# Altium footprint library Package_DFN_QFN.PcbLib: 557 footprints (part 26 of 35)
Each footprint in its own frame and in the unit in brackets; x right, y up, seen from the top. Pads: shape width x height; smd on the part's side, far side on the other; paste and mask are expansions set on the pad; w line width, h text height; cw(c..) or ccw(c..) is an arc to the next point about the centre after c.
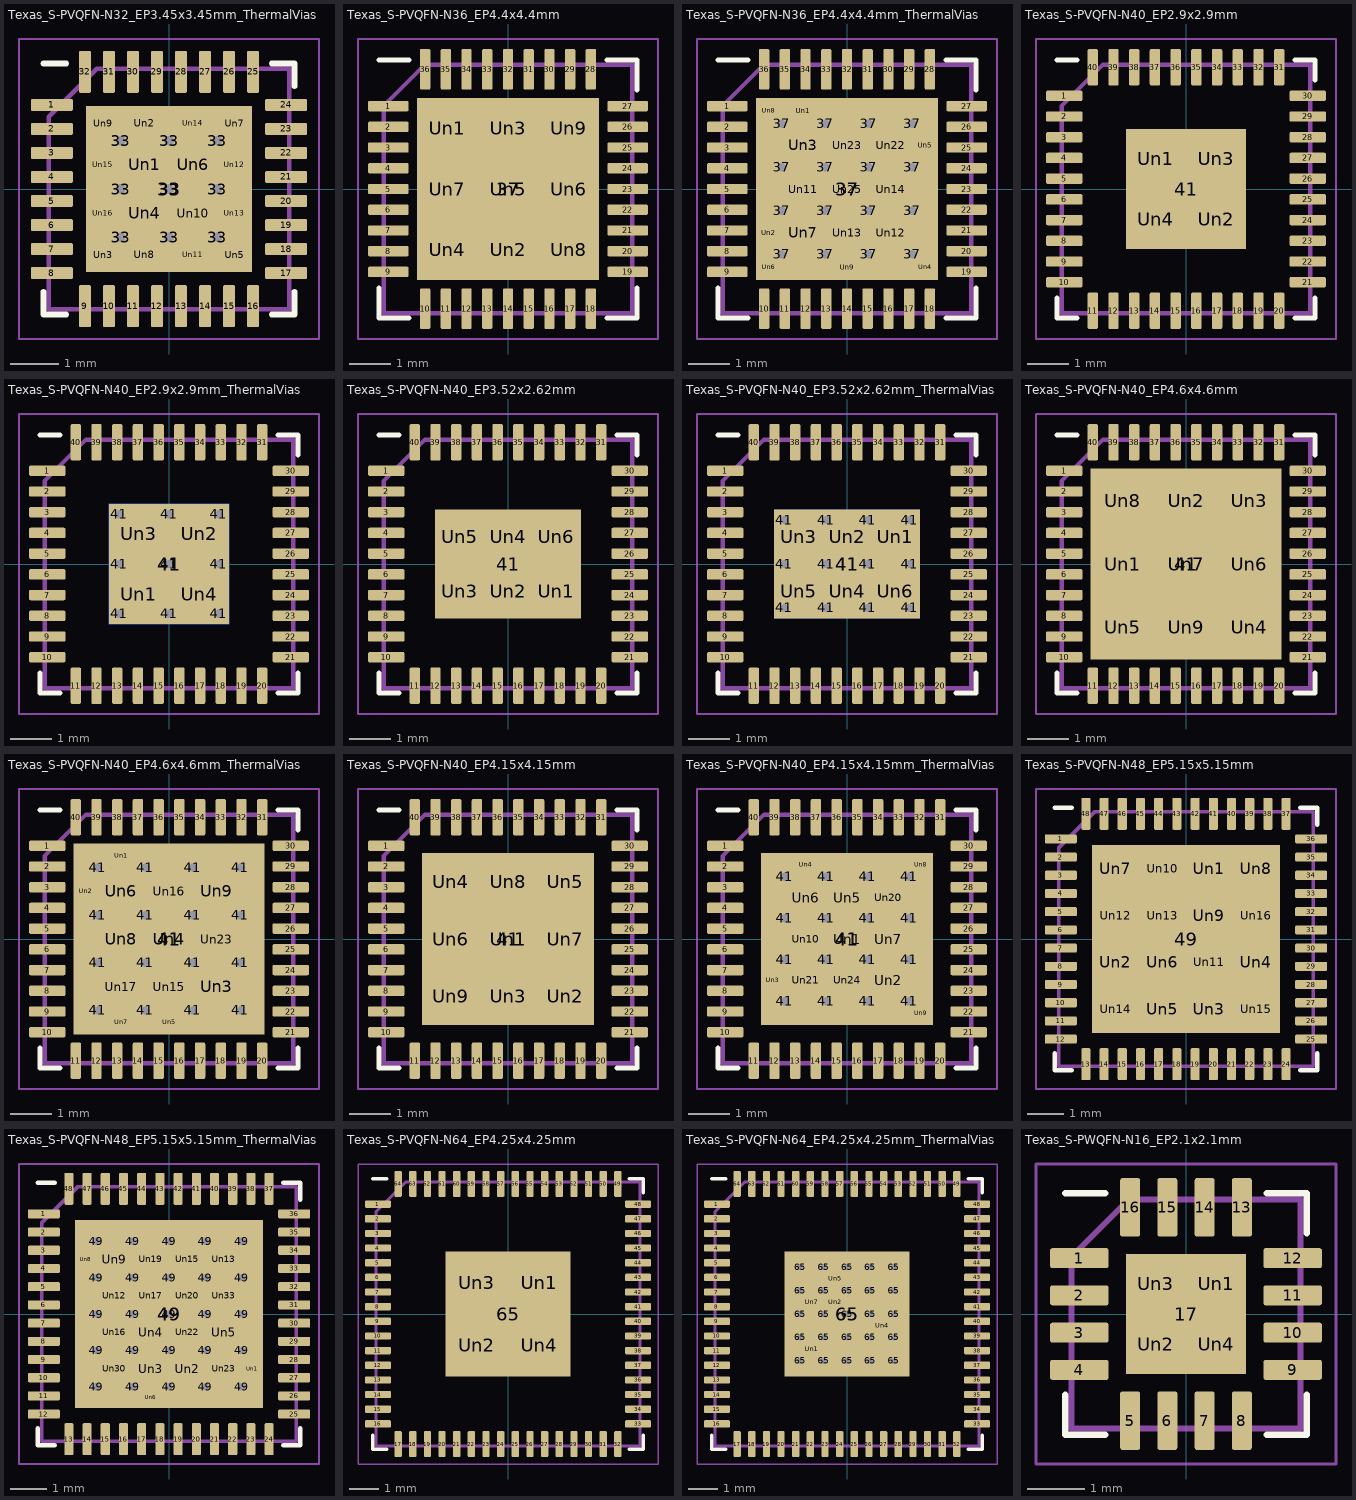
[diagram p25: the footprints below, top view; thin cyan lines are the x and y axes]

## Texas_S-PVQFN-N32_EP3.45x3.45mm_ThermalVias [mm]
pads (59):
  rrect25% 0.875x0.25 smd: 1(-2.438,1.75) 2(-2.438,1.25) 3(-2.438,0.75) 4(-2.438,0.25) 5(-2.438,-0.25) 6(-2.438,-0.75) 7(-2.438,-1.25) 8(-2.438,-1.75) 17(2.438,-1.75) 18(2.438,-1.25) 19(2.438,-0.75) 20(2.438,-0.25) 21(2.438,0.25) 22(2.438,0.75) 23(2.438,1.25) 24(2.438,1.75)
  rrect25% 0.25x0.875 smd: 9(-1.75,-2.438) 10(-1.25,-2.438) 11(-0.75,-2.438) 12(-0.25,-2.438) 13(0.25,-2.438) 14(0.75,-2.438) 15(1.25,-2.438) 16(1.75,-2.438) 25(1.75,2.438) 26(1.25,2.438) 27(0.75,2.438) 28(0.25,2.438) 29(-0.25,2.438) 30(-0.75,2.438) 31(-1.25,2.438) 32(-1.75,2.438)
  round 0.5 hole 0.2: 33(-1,-1) 33(-1,0) 33(-1,1) 33(0,-1) 33(0,0) 33(0,1) 33(1,-1) 33(1,0) 33(1,1)
  rect 3.45x3.45 smd: 33(0,0)
  rect 2.5x2.5 smd far side: 33(0,0)
  rrect25% 0.806x0.806 on Top Paste: Un1(-0.5,0.5) Un4(-0.5,-0.5) Un6(0.5,0.5) Un10(0.5,-0.5)
  round 0.503 on Top Paste: Un2(-0.5,1.362) Un8(-0.5,-1.362) Un11(0.5,-1.362) Un12(1.362,0.5) Un13(1.362,-0.5) Un14(0.5,1.362) Un15(-1.362,0.5) Un16(-1.362,-0.5)
  round 0.484 on Top Paste: Un3(-1.362,-1.362) Un5(1.362,-1.362) Un7(1.362,1.362) Un9(-1.362,1.362)
F.SilkS:
  lines w0.12: -2.61,-2.135 -2.61,-2.61 -2.135,-2.61 ; -2.61,2.61 -2.135,2.61 ; 2.135,-2.61 2.61,-2.61 2.61,-2.135 ; 2.135,2.61 2.61,2.61 2.61,2.135
F.Paste:
  region: -0.179,1.22 -0.246,1.152 -0.754,1.152 -0.821,1.22 -0.821,1.573 -0.179,1.573
  region: -1.171,-1.254 -1.171,-1.554 -1.554,-1.554 -1.554,-1.171 -1.254,-1.171
  region: 1.554,-1.554 1.171,-1.554 1.171,-1.254 1.254,-1.171 1.554,-1.171
  region: 1.554,1.171 1.254,1.171 1.171,1.254 1.171,1.554 1.554,1.554
  region: -0.179,-1.22 -0.179,-1.573 -0.821,-1.573 -0.821,-1.22 -0.754,-1.152 -0.246,-1.152
  region: -1.171,1.254 -1.254,1.171 -1.554,1.171 -1.554,1.554 -1.171,1.554
  region: 0.821,-1.22 0.821,-1.573 0.179,-1.573 0.179,-1.22 0.246,-1.152 0.754,-1.152
  region: 1.573,0.179 1.22,0.179 1.152,0.246 1.152,0.754 1.22,0.821 1.573,0.821
  region: 1.573,-0.821 1.22,-0.821 1.152,-0.754 1.152,-0.246 1.22,-0.179 1.573,-0.179
  region: 0.821,1.22 0.754,1.152 0.246,1.152 0.179,1.22 0.179,1.573 0.821,1.573
  region: -1.152,0.754 -1.152,0.246 -1.22,0.179 -1.573,0.179 -1.573,0.821 -1.22,0.821
  region: -1.152,-0.246 -1.152,-0.754 -1.22,-0.821 -1.573,-0.821 -1.573,-0.179 -1.22,-0.179
F.CrtYd:
  lines w0.05: -3.12,-3.12 3.12,-3.12 3.12,3.12 -3.12,3.12 -3.12,-3.12
F.Fab:
  lines w0.1: -2.5,-2.5 2.5,-2.5 2.5,2.5 -1.5,2.5 -2.5,1.5 -2.5,-2.5
  text "'.Designator'" at -4.047,-0.84 h1

## Texas_S-PVQFN-N36_EP4.4x4.4mm [mm]
pads (46):
  rrect25% 0.975x0.25 smd: 1(-2.887,2) 2(-2.887,1.5) 3(-2.887,1) 4(-2.887,0.5) 5(-2.887,0) 6(-2.887,-0.5) 7(-2.887,-1) 8(-2.887,-1.5) 9(-2.887,-2) 19(2.887,-2) 20(2.887,-1.5) 21(2.887,-1) 22(2.887,-0.5) 23(2.887,0) 24(2.887,0.5) 25(2.887,1) 26(2.887,1.5) 27(2.887,2)
  rrect25% 0.25x0.975 smd: 10(-2,-2.887) 11(-1.5,-2.887) 12(-1,-2.887) 13(-0.5,-2.887) 14(0,-2.887) 15(0.5,-2.887) 16(1,-2.887) 17(1.5,-2.887) 18(2,-2.887) 28(2,2.887) 29(1.5,2.887) 30(1,2.887) 31(0.5,2.887) 32(0,2.887) 33(-0.5,2.887) 34(-1,2.887) 35(-1.5,2.887) 36(-2,2.887)
  rect 4.4x4.4 smd: 37(0,0)
  rrect21% 1.18x1.18 on Top Paste: Un1(-1.47,1.47) Un2(0,-1.47) Un3(0,1.47) Un4(-1.47,-1.47) Un5(0,0) Un6(1.47,0) Un7(-1.47,0) Un8(1.47,-1.47) Un9(1.47,1.47)
F.SilkS:
  lines w0.12: -3.11,-2.385 -3.11,-3.11 -2.385,-3.11 ; -3.11,3.11 -2.385,3.11 ; 2.385,-3.11 3.11,-3.11 3.11,-2.385 ; 2.385,3.11 3.11,3.11 3.11,2.385
F.CrtYd:
  lines w0.05: -3.62,-3.62 -3.62,3.62 3.62,3.62 3.62,-3.62 -3.62,-3.62
F.Fab:
  lines w0.1: -3,-3 -3,2 -2,3 3,3 3,-3 -3,-3
  text "'.Designator'" at -4.047,-0.84 h1

## Texas_S-PVQFN-N36_EP4.4x4.4mm_ThermalVias [mm]
pads (79):
  rrect25% 0.975x0.25 smd: 1(-2.887,2) 2(-2.887,1.5) 3(-2.887,1) 4(-2.887,0.5) 5(-2.887,0) 6(-2.887,-0.5) 7(-2.887,-1) 8(-2.887,-1.5) 9(-2.887,-2) 19(2.887,-2) 20(2.887,-1.5) 21(2.887,-1) 22(2.887,-0.5) 23(2.887,0) 24(2.887,0.5) 25(2.887,1) 26(2.887,1.5) 27(2.887,2)
  rrect25% 0.25x0.975 smd: 10(-2,-2.887) 11(-1.5,-2.887) 12(-1,-2.887) 13(-0.5,-2.887) 14(0,-2.887) 15(0.5,-2.887) 16(1,-2.887) 17(1.5,-2.887) 18(2,-2.887) 28(2,2.887) 29(1.5,2.887) 30(1,2.887) 31(0.5,2.887) 32(0,2.887) 33(-0.5,2.887) 34(-1,2.887) 35(-1.5,2.887) 36(-2,2.887)
  round 0.5 hole 0.2: 37(-1.575,-1.575) 37(-1.575,-0.525) 37(-1.575,0.525) 37(-1.575,1.575) 37(-0.525,-1.575) 37(-0.525,-0.525) 37(-0.525,0.525) 37(-0.525,1.575) 37(0.525,-1.575) 37(0.525,-0.525) 37(0.525,0.525) 37(0.525,1.575) 37(1.575,-1.575) 37(1.575,-0.525) 37(1.575,0.525) 37(1.575,1.575)
  rect 3.65x3.65 smd far side: 37(0,0)
  rect 4.4x4.4 smd: 37(0,0)
  round 0.419 on Top Paste: Un1(-1.05,1.887) Un2(-1.887,-1.05) Un5(1.887,1.05) Un9(0,-1.887) Un10(1.05,1.887) Un15(1.887,0) Un16(1.887,-1.05) Un17(0,1.887) Un18(-1.887,0) Un19(-1.05,-1.887) Un20(1.05,-1.887) Un21(-1.887,1.05)
  rrect25% 0.847x0.847 on Top Paste: Un3(-1.05,1.05) Un7(-1.05,-1.05) Un11(-1.05,0) Un12(1.05,-1.05) Un13(0,-1.05) Un14(1.05,0) Un22(1.05,1.05) Un23(0,1.05) Un25(0,0)
  round 0.39 on Top Paste: Un4(1.887,-1.887) Un6(-1.887,-1.887) Un8(-1.887,1.887) Un24(1.887,1.887)
F.SilkS:
  lines w0.12: -3.11,-2.385 -3.11,-3.11 -2.385,-3.11 ; -3.11,3.11 -2.385,3.11 ; 2.385,-3.11 3.11,-3.11 3.11,-2.385 ; 2.385,3.11 3.11,3.11 3.11,2.385
F.Paste:
  region: -0.712,1.791 -0.783,1.721 -1.317,1.721 -1.388,1.791 -1.388,2.054 -0.712,2.054
  region: -1.721,-0.783 -1.721,-1.317 -1.791,-1.388 -2.054,-1.388 -2.054,-0.712 -1.791,-0.712
  region: 2.025,-2.025 1.75,-2.025 1.75,-1.845 1.845,-1.75 2.025,-1.75
  region: 2.054,0.712 1.791,0.712 1.721,0.783 1.721,1.317 1.791,1.388 2.054,1.388
  region: -1.75,-1.845 -1.75,-2.025 -2.025,-2.025 -2.025,-1.75 -1.845,-1.75
  region: -1.75,1.845 -1.845,1.75 -2.025,1.75 -2.025,2.025 -1.75,2.025
  region: 0.338,-1.791 0.338,-2.054 -0.338,-2.054 -0.338,-1.791 -0.267,-1.721 0.267,-1.721
  region: 1.388,1.791 1.317,1.721 0.783,1.721 0.712,1.791 0.712,2.054 1.388,2.054
  region: 2.054,-0.338 1.791,-0.338 1.721,-0.267 1.721,0.267 1.791,0.338 2.054,0.338
  region: 2.054,-1.388 1.791,-1.388 1.721,-1.317 1.721,-0.783 1.791,-0.712 2.054,-0.712
  region: 0.338,1.791 0.267,1.721 -0.267,1.721 -0.338,1.791 -0.338,2.054 0.338,2.054
  region: -1.721,0.267 -1.721,-0.267 -1.791,-0.338 -2.054,-0.338 -2.054,0.338 -1.791,0.338
  region: -0.712,-1.791 -0.712,-2.054 -1.388,-2.054 -1.388,-1.791 -1.317,-1.721 -0.783,-1.721
  region: 1.388,-1.791 1.388,-2.054 0.712,-2.054 0.712,-1.791 0.783,-1.721 1.317,-1.721
  region: -1.721,1.317 -1.721,0.783 -1.791,0.712 -2.054,0.712 -2.054,1.388 -1.791,1.388
  region: 2.025,1.75 1.845,1.75 1.75,1.845 1.75,2.025 2.025,2.025
F.CrtYd:
  lines w0.05: -3.62,-3.62 -3.62,3.62 3.62,3.62 3.62,-3.62 -3.62,-3.62
F.Fab:
  lines w0.1: -3,-3 3,-3 3,3 -2,3 -3,2 -3,-3
  text "'.Designator'" at -4.047,-0.84 h1

## Texas_S-PVQFN-N40_EP2.9x2.9mm [mm]
pads (45):
  rrect25% 0.875x0.25 smd: 1(-2.937,2.25) 2(-2.937,1.75) 3(-2.937,1.25) 4(-2.937,0.75) 5(-2.937,0.25) 6(-2.937,-0.25) 7(-2.937,-0.75) 8(-2.937,-1.25) 9(-2.937,-1.75) 10(-2.937,-2.25) 21(2.937,-2.25) 22(2.937,-1.75) 23(2.937,-1.25) 24(2.937,-0.75) 25(2.937,-0.25) 26(2.937,0.25) 27(2.937,0.75) 28(2.937,1.25) 29(2.937,1.75) 30(2.937,2.25)
  rrect25% 0.25x0.875 smd: 11(-2.25,-2.937) 12(-1.75,-2.937) 13(-1.25,-2.937) 14(-0.75,-2.937) 15(-0.25,-2.937) 16(0.25,-2.937) 17(0.75,-2.937) 18(1.25,-2.937) 19(1.75,-2.937) 20(2.25,-2.937) 31(2.25,2.937) 32(1.75,2.937) 33(1.25,2.937) 34(0.75,2.937) 35(0.25,2.937) 36(-0.25,2.937) 37(-0.75,2.937) 38(-1.25,2.937) 39(-1.75,2.937) 40(-2.25,2.937)
  rect 2.9x2.9 smd: 41(0,0)
  rrect21% 1.17x1.17 on Top Paste: Un1(-0.725,0.725) Un2(0.725,-0.725) Un3(0.725,0.725) Un4(-0.725,-0.725)
F.SilkS:
  lines w0.12: -3.11,-2.635 -3.11,-3.11 -2.635,-3.11 ; -3.11,3.11 -2.635,3.11 ; 2.635,-3.11 3.11,-3.11 3.11,-2.635 ; 2.635,3.11 3.11,3.11 3.11,2.635
F.CrtYd:
  lines w0.05: -3.62,-3.62 3.62,-3.62 3.62,3.62 -3.62,3.62 -3.62,-3.62
F.Fab:
  lines w0.1: -3,-3 3,-3 3,3 -2,3 -3,2 -3,-3
  text "'.Designator'" at -4.047,-0.84 h1

## Texas_S-PVQFN-N40_EP2.9x2.9mm_ThermalVias [mm]
pads (55):
  rrect25% 0.875x0.25 smd: 1(-2.937,2.25) 2(-2.937,1.75) 3(-2.937,1.25) 4(-2.937,0.75) 5(-2.937,0.25) 6(-2.937,-0.25) 7(-2.937,-0.75) 8(-2.937,-1.25) 9(-2.937,-1.75) 10(-2.937,-2.25) 21(2.937,-2.25) 22(2.937,-1.75) 23(2.937,-1.25) 24(2.937,-0.75) 25(2.937,-0.25) 26(2.937,0.25) 27(2.937,0.75) 28(2.937,1.25) 29(2.937,1.75) 30(2.937,2.25)
  rrect25% 0.25x0.875 smd: 11(-2.25,-2.937) 12(-1.75,-2.937) 13(-1.25,-2.937) 14(-0.75,-2.937) 15(-0.25,-2.937) 16(0.25,-2.937) 17(0.75,-2.937) 18(1.25,-2.937) 19(1.75,-2.937) 20(2.25,-2.937) 31(2.25,2.937) 32(1.75,2.937) 33(1.25,2.937) 34(0.75,2.937) 35(0.25,2.937) 36(-0.25,2.937) 37(-0.75,2.937) 38(-1.25,2.937) 39(-1.75,2.937) 40(-2.25,2.937)
  round 0.5 hole 0.2: 41(-1.2,-1.2) 41(-1.2,0) 41(-1.2,1.2) 41(0,-1.2) 41(0,0) 41(0,1.2) 41(1.2,-1.2) 41(1.2,0) 41(1.2,1.2)
  rect 2.9x2.9 smd: 41(0,0)
  rect 2.9x2.9 smd far side: 41(0,0)
  rrect21% 1.21x1.21 on Top Paste: Un1(-0.725,-0.725) Un2(0.725,0.725) Un3(-0.725,0.725) Un4(0.725,-0.725)
F.SilkS:
  lines w0.12: -3.11,-2.635 -3.11,-3.11 -2.635,-3.11 ; -3.11,3.11 -2.635,3.11 ; 2.635,-3.11 3.11,-3.11 3.11,-2.635 ; 2.635,3.11 3.11,3.11 3.11,2.635
F.CrtYd:
  lines w0.05: -3.62,-3.62 3.62,-3.62 3.62,3.62 -3.62,3.62 -3.62,-3.62
F.Fab:
  lines w0.1: -3,-3 -3,2 -2,3 3,3 3,-3 -3,-3
  text "'.Designator'" at -4.047,-0.84 h1

## Texas_S-PVQFN-N40_EP3.52x2.62mm [mm]
pads (47):
  rrect25% 0.875x0.25 smd: 1(-2.937,2.25) 2(-2.937,1.75) 3(-2.937,1.25) 4(-2.937,0.75) 5(-2.937,0.25) 6(-2.937,-0.25) 7(-2.937,-0.75) 8(-2.937,-1.25) 9(-2.937,-1.75) 10(-2.937,-2.25) 21(2.937,-2.25) 22(2.937,-1.75) 23(2.937,-1.25) 24(2.937,-0.75) 25(2.937,-0.25) 26(2.937,0.25) 27(2.937,0.75) 28(2.937,1.25) 29(2.937,1.75) 30(2.937,2.25)
  rrect25% 0.25x0.875 smd: 11(-2.25,-2.937) 12(-1.75,-2.937) 13(-1.25,-2.937) 14(-0.75,-2.937) 15(-0.25,-2.937) 16(0.25,-2.937) 17(0.75,-2.937) 18(1.25,-2.937) 19(1.75,-2.937) 20(2.25,-2.937) 31(2.25,2.937) 32(1.75,2.937) 33(1.25,2.937) 34(0.75,2.937) 35(0.25,2.937) 36(-0.25,2.937) 37(-0.75,2.937) 38(-1.25,2.937) 39(-1.75,2.937) 40(-2.25,2.937)
  rect 3.52x2.62 smd: 41(0,0)
  rrect25% 0.95x1.06 on Top Paste: Un1(1.17,-0.655) Un2(0,-0.655) Un3(-1.17,-0.655) Un4(0,0.655) Un5(-1.17,0.655) Un6(1.17,0.655)
F.SilkS:
  lines w0.12: -3.11,-2.635 -3.11,-3.11 -2.635,-3.11 ; -3.11,3.11 -2.635,3.11 ; 2.635,-3.11 3.11,-3.11 3.11,-2.635 ; 2.635,3.11 3.11,3.11 3.11,2.635
F.CrtYd:
  lines w0.05: -3.62,-3.62 3.62,-3.62 3.62,3.62 -3.62,3.62 -3.62,-3.62
F.Fab:
  lines w0.1: -3,-3 -3,2 -2,3 3,3 3,-3 -3,-3
  text "'.Designator'" at -4.047,-0.84 h1

## Texas_S-PVQFN-N40_EP3.52x2.62mm_ThermalVias [mm]
pads (60):
  rrect25% 0.875x0.25 smd: 1(-2.937,2.25) 2(-2.937,1.75) 3(-2.937,1.25) 4(-2.937,0.75) 5(-2.937,0.25) 6(-2.937,-0.25) 7(-2.937,-0.75) 8(-2.937,-1.25) 9(-2.937,-1.75) 10(-2.937,-2.25) 21(2.937,-2.25) 22(2.937,-1.75) 23(2.937,-1.25) 24(2.937,-0.75) 25(2.937,-0.25) 26(2.937,0.25) 27(2.937,0.75) 28(2.937,1.25) 29(2.937,1.75) 30(2.937,2.25)
  rrect25% 0.25x0.875 smd: 11(-2.25,-2.937) 12(-1.75,-2.937) 13(-1.25,-2.937) 14(-0.75,-2.937) 15(-0.25,-2.937) 16(0.25,-2.937) 17(0.75,-2.937) 18(1.25,-2.937) 19(1.75,-2.937) 20(2.25,-2.937) 31(2.25,2.937) 32(1.75,2.937) 33(1.25,2.937) 34(0.75,2.937) 35(0.25,2.937) 36(-0.25,2.937) 37(-0.75,2.937) 38(-1.25,2.937) 39(-1.75,2.937) 40(-2.25,2.937)
  round 0.5 hole 0.2: 41(-1.51,-1.06) 41(-1.51,0) 41(-1.51,1.06) 41(-0.503,-1.06) 41(-0.503,0) 41(-0.503,1.06) 41(0.503,-1.06) 41(0.503,0) 41(0.503,1.06) 41(1.51,-1.06) 41(1.51,0) 41(1.51,1.06)
  rect 3.52x2.62 smd far side: 41(0,0)
  rect 3.52x2.62 smd: 41(0,0)
  rrect25% 0.98x1.1 on Top Paste: Un1(1.17,0.655) Un2(0,0.655) Un3(-1.17,0.655) Un4(0,-0.655) Un5(-1.17,-0.655) Un6(1.17,-0.655)
F.SilkS:
  lines w0.12: -3.11,-2.635 -3.11,-3.11 -2.635,-3.11 ; -3.11,3.11 -2.635,3.11 ; 2.635,-3.11 3.11,-3.11 3.11,-2.635 ; 2.635,3.11 3.11,3.11 3.11,2.635
F.CrtYd:
  lines w0.05: -3.62,-3.62 3.62,-3.62 3.62,3.62 -3.62,3.62 -3.62,-3.62
F.Fab:
  lines w0.1: -3,-3 -3,2 -2,3 3,3 3,-3 -3,-3
  text "'.Designator'" at -4.047,-0.84 h1

## Texas_S-PVQFN-N40_EP4.6x4.6mm [mm]
pads (50):
  rrect25% 0.875x0.25 smd: 1(-2.937,2.25) 2(-2.937,1.75) 3(-2.937,1.25) 4(-2.937,0.75) 5(-2.937,0.25) 6(-2.937,-0.25) 7(-2.937,-0.75) 8(-2.937,-1.25) 9(-2.937,-1.75) 10(-2.937,-2.25) 21(2.937,-2.25) 22(2.937,-1.75) 23(2.937,-1.25) 24(2.937,-0.75) 25(2.937,-0.25) 26(2.937,0.25) 27(2.937,0.75) 28(2.937,1.25) 29(2.937,1.75) 30(2.937,2.25)
  rrect25% 0.25x0.875 smd: 11(-2.25,-2.937) 12(-1.75,-2.937) 13(-1.25,-2.937) 14(-0.75,-2.937) 15(-0.25,-2.937) 16(0.25,-2.937) 17(0.75,-2.937) 18(1.25,-2.937) 19(1.75,-2.937) 20(2.25,-2.937) 31(2.25,2.937) 32(1.75,2.937) 33(1.25,2.937) 34(0.75,2.937) 35(0.25,2.937) 36(-0.25,2.937) 37(-0.75,2.937) 38(-1.25,2.937) 39(-1.75,2.937) 40(-2.25,2.937)
  rect 4.6x4.6 smd: 41(0,0)
  rrect20% 1.24x1.24 on Top Paste: Un1(-1.53,0) Un2(0,1.53) Un3(1.53,1.53) Un4(1.53,-1.53) Un5(-1.53,-1.53) Un6(1.53,0) Un7(0,0) Un8(-1.53,1.53) Un9(0,-1.53)
F.SilkS:
  lines w0.12: -3.11,-2.635 -3.11,-3.11 -2.635,-3.11 ; -3.11,3.11 -2.635,3.11 ; 2.635,-3.11 3.11,-3.11 3.11,-2.635 ; 2.635,3.11 3.11,3.11 3.11,2.635
F.CrtYd:
  lines w0.05: -3.62,-3.62 3.62,-3.62 3.62,3.62 -3.62,3.62 -3.62,-3.62
F.Fab:
  lines w0.1: -3,-3 -3,2 -2,3 3,3 3,-3 -3,-3
  text "'.Designator'" at -4.047,-0.84 h1

## Texas_S-PVQFN-N40_EP4.6x4.6mm_ThermalVias [mm]
pads (83):
  rrect25% 0.875x0.25 smd: 1(-2.937,2.25) 2(-2.937,1.75) 3(-2.937,1.25) 4(-2.937,0.75) 5(-2.937,0.25) 6(-2.937,-0.25) 7(-2.937,-0.75) 8(-2.937,-1.25) 9(-2.937,-1.75) 10(-2.937,-2.25) 21(2.937,-2.25) 22(2.937,-1.75) 23(2.937,-1.25) 24(2.937,-0.75) 25(2.937,-0.25) 26(2.937,0.25) 27(2.937,0.75) 28(2.937,1.25) 29(2.937,1.75) 30(2.937,2.25)
  rrect25% 0.25x0.875 smd: 11(-2.25,-2.937) 12(-1.75,-2.937) 13(-1.25,-2.937) 14(-0.75,-2.937) 15(-0.25,-2.937) 16(0.25,-2.937) 17(0.75,-2.937) 18(1.25,-2.937) 19(1.75,-2.937) 20(2.25,-2.937) 31(2.25,2.937) 32(1.75,2.937) 33(1.25,2.937) 34(0.75,2.937) 35(0.25,2.937) 36(-0.25,2.937) 37(-0.75,2.937) 38(-1.25,2.937) 39(-1.75,2.937) 40(-2.25,2.937)
  round 0.5 hole 0.2: 41(-1.725,-1.725) 41(-1.725,-0.575) 41(-1.725,0.575) 41(-1.725,1.725) 41(-0.575,-1.725) 41(-0.575,-0.575) 41(-0.575,0.575) 41(-0.575,1.725) 41(0.575,-1.725) 41(0.575,-0.575) 41(0.575,0.575) 41(0.575,1.725) 41(1.725,-1.725) 41(1.725,-0.575) 41(1.725,0.575) 41(1.725,1.725)
  rect 4.6x4.6 smd: 41(0,0)
  rect 3.95x3.95 smd far side: 41(0,0)
  round 0.382 on Top Paste: Un1(-1.15,2.013) Un2(-2.013,1.15) Un5(0,-2.013) Un7(-1.15,-2.013) Un11(2.013,1.15) Un12(1.15,2.013) Un13(2.013,-1.15) Un14(-2.013,0) Un18(-2.013,-1.15) Un21(0,2.013) Un24(2.013,0) Un25(1.15,-2.013)
  rrect25% 0.927x0.927 on Top Paste: Un3(1.15,-1.15) Un4(0,0) Un6(-1.15,1.15) Un8(-1.15,0) Un9(1.15,1.15) Un15(0,-1.15) Un16(0,1.15) Un17(-1.15,-1.15) Un23(1.15,0)
  round 0.342 on Top Paste: Un10(2.013,-2.013) Un19(-2.013,-2.013) Un20(2.013,2.013) Un22(-2.013,2.013)
F.SilkS:
  lines w0.12: -3.11,-2.635 -3.11,-3.11 -2.635,-3.11 ; -3.11,3.11 -2.635,3.11 ; 2.635,-3.11 3.11,-3.11 3.11,-2.635 ; 2.635,3.11 3.11,3.11 3.11,2.635
F.Paste:
  region: -0.768,1.93 -0.836,1.863 -1.464,1.863 -1.532,1.93 -1.532,2.162 -0.768,2.162
  region: -1.863,1.464 -1.863,0.836 -1.93,0.768 -2.162,0.768 -2.162,1.532 -1.93,1.532
  region: 0.382,-1.93 0.382,-2.162 -0.382,-2.162 -0.382,-1.93 -0.314,-1.863 0.314,-1.863
  region: -0.768,-1.93 -0.768,-2.162 -1.532,-2.162 -1.532,-1.93 -1.464,-1.863 -0.836,-1.863
  region: 2.128,-2.128 1.897,-2.128 1.897,-2 2,-1.897 2.128,-1.897
  region: 2.162,0.768 1.93,0.768 1.863,0.836 1.863,1.464 1.93,1.532 2.162,1.532
  region: 1.532,1.93 1.464,1.863 0.836,1.863 0.768,1.93 0.768,2.162 1.532,2.162
  region: 2.162,-1.532 1.93,-1.532 1.863,-1.464 1.863,-0.836 1.93,-0.768 2.162,-0.768
  region: -1.863,0.314 -1.863,-0.314 -1.93,-0.382 -2.162,-0.382 -2.162,0.382 -1.93,0.382
  region: -1.863,-0.836 -1.863,-1.464 -1.93,-1.532 -2.162,-1.532 -2.162,-0.768 -1.93,-0.768
  region: -1.897,-2 -1.897,-2.128 -2.128,-2.128 -2.128,-1.897 -2,-1.897
  region: 2.128,1.897 2,1.897 1.897,2 1.897,2.128 2.128,2.128
  region: 0.382,1.93 0.314,1.863 -0.314,1.863 -0.382,1.93 -0.382,2.162 0.382,2.162
  region: -1.897,2 -2,1.897 -2.128,1.897 -2.128,2.128 -1.897,2.128
  region: 2.162,-0.382 1.93,-0.382 1.863,-0.314 1.863,0.314 1.93,0.382 2.162,0.382
  region: 1.532,-1.93 1.532,-2.162 0.768,-2.162 0.768,-1.93 0.836,-1.863 1.464,-1.863
F.CrtYd:
  lines w0.05: -3.62,-3.62 3.62,-3.62 3.62,3.62 -3.62,3.62 -3.62,-3.62
F.Fab:
  lines w0.1: -3,-3 -3,2 -2,3 3,3 3,-3 -3,-3
  text "'.Designator'" at -4.047,-0.84 h1

## Texas_S-PVQFN-N40_EP4.15x4.15mm [mm]
pads (50):
  rrect25% 0.875x0.25 smd: 1(-2.937,2.25) 2(-2.937,1.75) 3(-2.937,1.25) 4(-2.937,0.75) 5(-2.937,0.25) 6(-2.937,-0.25) 7(-2.937,-0.75) 8(-2.937,-1.25) 9(-2.937,-1.75) 10(-2.937,-2.25) 21(2.937,-2.25) 22(2.937,-1.75) 23(2.937,-1.25) 24(2.937,-0.75) 25(2.937,-0.25) 26(2.937,0.25) 27(2.937,0.75) 28(2.937,1.25) 29(2.937,1.75) 30(2.937,2.25)
  rrect25% 0.25x0.875 smd: 11(-2.25,-2.937) 12(-1.75,-2.937) 13(-1.25,-2.937) 14(-0.75,-2.937) 15(-0.25,-2.937) 16(0.25,-2.937) 17(0.75,-2.937) 18(1.25,-2.937) 19(1.75,-2.937) 20(2.25,-2.937) 31(2.25,2.937) 32(1.75,2.937) 33(1.25,2.937) 34(0.75,2.937) 35(0.25,2.937) 36(-0.25,2.937) 37(-0.75,2.937) 38(-1.25,2.937) 39(-1.75,2.937) 40(-2.25,2.937)
  rect 4.15x4.15 smd: 41(0,0)
  rrect22% 1.12x1.12 on Top Paste: Un1(0,0) Un2(1.38,-1.38) Un3(0,-1.38) Un4(-1.38,1.38) Un5(1.38,1.38) Un6(-1.38,0) Un7(1.38,0) Un8(0,1.38) Un9(-1.38,-1.38)
F.SilkS:
  lines w0.12: -3.11,-2.635 -3.11,-3.11 -2.635,-3.11 ; -3.11,3.11 -2.635,3.11 ; 2.635,-3.11 3.11,-3.11 3.11,-2.635 ; 2.635,3.11 3.11,3.11 3.11,2.635
F.CrtYd:
  lines w0.05: -3.62,-3.62 -3.62,3.62 3.62,3.62 3.62,-3.62 -3.62,-3.62
F.Fab:
  lines w0.1: -3,-3 -3,2 -2,3 3,3 3,-3 -3,-3
  text "'.Designator'" at -4.047,-0.84 h1

## Texas_S-PVQFN-N40_EP4.15x4.15mm_ThermalVias [mm]
pads (83):
  rrect25% 0.875x0.25 smd: 1(-2.937,2.25) 2(-2.937,1.75) 3(-2.937,1.25) 4(-2.937,0.75) 5(-2.937,0.25) 6(-2.937,-0.25) 7(-2.937,-0.75) 8(-2.937,-1.25) 9(-2.937,-1.75) 10(-2.937,-2.25) 21(2.937,-2.25) 22(2.937,-1.75) 23(2.937,-1.25) 24(2.937,-0.75) 25(2.937,-0.25) 26(2.937,0.25) 27(2.937,0.75) 28(2.937,1.25) 29(2.937,1.75) 30(2.937,2.25)
  rrect25% 0.25x0.875 smd: 11(-2.25,-2.937) 12(-1.75,-2.937) 13(-1.25,-2.937) 14(-0.75,-2.937) 15(-0.25,-2.937) 16(0.25,-2.937) 17(0.75,-2.937) 18(1.25,-2.937) 19(1.75,-2.937) 20(2.25,-2.937) 31(2.25,2.937) 32(1.75,2.937) 33(1.25,2.937) 34(0.75,2.937) 35(0.25,2.937) 36(-0.25,2.937) 37(-0.75,2.937) 38(-1.25,2.937) 39(-1.75,2.937) 40(-2.25,2.937)
  round 0.5 hole 0.2: 41(-1.5,-1.5) 41(-1.5,-0.5) 41(-1.5,0.5) 41(-1.5,1.5) 41(-0.5,-1.5) 41(-0.5,-0.5) 41(-0.5,0.5) 41(-0.5,1.5) 41(0.5,-1.5) 41(0.5,-0.5) 41(0.5,0.5) 41(0.5,1.5) 41(1.5,-1.5) 41(1.5,-0.5) 41(1.5,0.5) 41(1.5,1.5)
  rect 4.15x4.15 smd: 41(0,0)
  rect 3.5x3.5 smd far side: 41(0,0)
  rrect25% 0.806x0.806 on Top Paste: Un1(0,0) Un2(1,-1) Un5(0,1) Un6(-1,1) Un7(1,0) Un10(-1,0) Un20(1,1) Un21(-1,-1) Un24(0,-1)
  round 0.371 on Top Paste: Un3(-1.787,-1) Un4(-1,1.787) Un12(-1,-1.787) Un13(0,-1.787) Un14(1.787,1) Un16(1.787,-1) Un17(-1.787,0) Un18(1,-1.787) Un19(0,1.787) Un22(-1.787,1) Un23(1,1.787) Un25(1.787,0)
  round 0.342 on Top Paste: Un8(1.787,1.787) Un9(1.787,-1.787) Un11(-1.787,-1.787) Un15(-1.787,1.787)
F.SilkS:
  lines w0.12: -3.11,-2.635 -3.11,-3.11 -2.635,-3.11 ; -3.11,3.11 -2.635,3.11 ; 2.635,-3.11 3.11,-3.11 3.11,-2.635 ; 2.635,3.11 3.11,3.11 3.11,2.635
F.Paste:
  region: -1.648,-0.765 -1.648,-1.235 -1.724,-1.311 -1.927,-1.311 -1.927,-0.689 -1.724,-0.689
  region: -0.689,1.724 -0.765,1.648 -1.235,1.648 -1.311,1.724 -1.311,1.927 -0.689,1.927
  region: 1.903,1.672 1.775,1.672 1.672,1.775 1.672,1.903 1.903,1.903
  region: 1.903,-1.903 1.672,-1.903 1.672,-1.775 1.775,-1.672 1.903,-1.672
  region: -1.672,-1.775 -1.672,-1.903 -1.903,-1.903 -1.903,-1.672 -1.775,-1.672
  region: -0.689,-1.724 -0.689,-1.927 -1.311,-1.927 -1.311,-1.724 -1.235,-1.648 -0.765,-1.648
  region: 0.311,-1.724 0.311,-1.927 -0.311,-1.927 -0.311,-1.724 -0.235,-1.648 0.235,-1.648
  region: 1.927,0.689 1.724,0.689 1.648,0.765 1.648,1.235 1.724,1.311 1.927,1.311
  region: -1.672,1.775 -1.775,1.672 -1.903,1.672 -1.903,1.903 -1.672,1.903
  region: 1.927,-1.311 1.724,-1.311 1.648,-1.235 1.648,-0.765 1.724,-0.689 1.927,-0.689
  region: -1.648,0.235 -1.648,-0.235 -1.724,-0.311 -1.927,-0.311 -1.927,0.311 -1.724,0.311
  region: 1.311,-1.724 1.311,-1.927 0.689,-1.927 0.689,-1.724 0.765,-1.648 1.235,-1.648
  region: 0.311,1.724 0.235,1.648 -0.235,1.648 -0.311,1.724 -0.311,1.927 0.311,1.927
  region: -1.648,1.235 -1.648,0.765 -1.724,0.689 -1.927,0.689 -1.927,1.311 -1.724,1.311
  region: 1.311,1.724 1.235,1.648 0.765,1.648 0.689,1.724 0.689,1.927 1.311,1.927
  region: 1.927,-0.311 1.724,-0.311 1.648,-0.235 1.648,0.235 1.724,0.311 1.927,0.311
F.CrtYd:
  lines w0.05: -3.62,-3.62 3.62,-3.62 3.62,3.62 -3.62,3.62 -3.62,-3.62
F.Fab:
  lines w0.1: -3,-3 3,-3 3,3 -2,3 -3,2 -3,-3
  text "'.Designator'" at -4.047,-0.84 h1

## Texas_S-PVQFN-N48_EP5.15x5.15mm [mm]
pads (65):
  rrect25% 0.875x0.25 smd: 1(-3.437,2.75) 2(-3.437,2.25) 3(-3.437,1.75) 4(-3.437,1.25) 5(-3.437,0.75) 6(-3.437,0.25) 7(-3.437,-0.25) 8(-3.437,-0.75) 9(-3.437,-1.25) 10(-3.437,-1.75) 11(-3.437,-2.25) 12(-3.437,-2.75) 25(3.437,-2.75) 26(3.437,-2.25) 27(3.437,-1.75) 28(3.437,-1.25) 29(3.437,-0.75) 30(3.437,-0.25) 31(3.437,0.25) 32(3.437,0.75) 33(3.437,1.25) 34(3.437,1.75) 35(3.437,2.25) 36(3.437,2.75)
  rrect25% 0.25x0.875 smd: 13(-2.75,-3.437) 14(-2.25,-3.437) 15(-1.75,-3.437) 16(-1.25,-3.437) 17(-0.75,-3.437) 18(-0.25,-3.437) 19(0.25,-3.437) 20(0.75,-3.437) 21(1.25,-3.437) 22(1.75,-3.437) 23(2.25,-3.437) 24(2.75,-3.437) 37(2.75,3.437) 38(2.25,3.437) 39(1.75,3.437) 40(1.25,3.437) 41(0.75,3.437) 42(0.25,3.437) 43(-0.25,3.437) 44(-0.75,3.437) 45(-1.25,3.437) 46(-1.75,3.437) 47(-2.25,3.437) 48(-2.75,3.437)
  rect 5.15x5.15 smd: 49(0,0)
  rrect24% 1.04x1.04 on Top Paste: Un1(0.645,1.935) Un2(-1.935,-0.645) Un3(0.645,-1.935) Un4(1.935,-0.645) Un5(-0.645,-1.935) Un6(-0.645,-0.645) Un7(-1.935,1.935) Un8(1.935,1.935) Un9(0.645,0.645) Un10(-0.645,1.935) Un11(0.645,-0.645) Un12(-1.935,0.645) Un13(-0.645,0.645) Un14(-1.935,-1.935) Un15(1.935,-1.935) Un16(1.935,0.645)
F.SilkS:
  lines w0.12: -3.61,-3.135 -3.61,-3.61 -3.135,-3.61 ; -3.61,3.61 -3.135,3.61 ; 3.135,-3.61 3.61,-3.61 3.61,-3.135 ; 3.135,3.61 3.61,3.61 3.61,3.135
F.CrtYd:
  lines w0.05: -4.12,-4.12 -4.12,4.12 4.12,4.12 4.12,-4.12 -4.12,-4.12
F.Fab:
  lines w0.1: -3.5,-3.5 -3.5,2.5 -2.5,3.5 3.5,3.5 3.5,-3.5 -3.5,-3.5
  text "'.Designator'" at -4.047,-0.84 h1

## Texas_S-PVQFN-N48_EP5.15x5.15mm_ThermalVias [mm]
pads (111):
  rrect25% 0.875x0.25 smd: 1(-3.437,2.75) 2(-3.437,2.25) 3(-3.437,1.75) 4(-3.437,1.25) 5(-3.437,0.75) 6(-3.437,0.25) 7(-3.437,-0.25) 8(-3.437,-0.75) 9(-3.437,-1.25) 10(-3.437,-1.75) 11(-3.437,-2.25) 12(-3.437,-2.75) 25(3.437,-2.75) 26(3.437,-2.25) 27(3.437,-1.75) 28(3.437,-1.25) 29(3.437,-0.75) 30(3.437,-0.25) 31(3.437,0.25) 32(3.437,0.75) 33(3.437,1.25) 34(3.437,1.75) 35(3.437,2.25) 36(3.437,2.75)
  rrect25% 0.25x0.875 smd: 13(-2.75,-3.437) 14(-2.25,-3.437) 15(-1.75,-3.437) 16(-1.25,-3.437) 17(-0.75,-3.437) 18(-0.25,-3.437) 19(0.25,-3.437) 20(0.75,-3.437) 21(1.25,-3.437) 22(1.75,-3.437) 23(2.25,-3.437) 24(2.75,-3.437) 37(2.75,3.437) 38(2.25,3.437) 39(1.75,3.437) 40(1.25,3.437) 41(0.75,3.437) 42(0.25,3.437) 43(-0.25,3.437) 44(-0.75,3.437) 45(-1.25,3.437) 46(-1.75,3.437) 47(-2.25,3.437) 48(-2.75,3.437)
  round 0.5 hole 0.2: 49(-2,-2) 49(-2,-1) 49(-2,0) 49(-2,1) 49(-2,2) 49(-1,-2) 49(-1,-1) 49(-1,0) 49(-1,1) 49(-1,2) 49(0,-2) 49(0,-1) 49(0,0) 49(0,1) 49(0,2) 49(1,-2) 49(1,-1) 49(1,0) 49(1,1) 49(1,2) 49(2,-2) 49(2,-1) 49(2,0) 49(2,1) 49(2,2)
  rect 4.5x4.5 smd far side: 49(0,0)
  rect 5.15x5.15 smd: 49(0,0)
  round 0.371 on Top Paste: Un1(2.288,-1.5) Un6(-0.5,-2.288) Un8(-2.288,1.5) Un10(2.288,1.5) Un11(-0.5,2.288) Un14(-2.288,-1.5) Un21(0.5,2.288) Un24(2.288,-0.5) Un25(1.5,-2.288) Un27(-2.288,-0.5) Un28(-1.5,-2.288) Un29(-2.288,0.5) Un32(2.288,0.5) Un34(0.5,-2.288) Un35(-1.5,2.288) Un36(1.5,2.288)
  rrect25% 0.806x0.806 on Top Paste: Un2(0.5,-1.5) Un3(-0.5,-1.5) Un4(-0.5,-0.5) Un5(1.5,-0.5) Un9(-1.5,1.5) Un12(-1.5,0.5) Un13(1.5,1.5) Un15(0.5,1.5) Un16(-1.5,-0.5) Un17(-0.5,0.5) Un19(-0.5,1.5) Un20(0.5,0.5) Un22(0.5,-0.5) Un23(1.5,-1.5) Un30(-1.5,-1.5) Un33(1.5,0.5)
  round 0.342 on Top Paste: Un7(-2.288,-2.288) Un18(2.288,-2.288) Un26(2.288,2.288) Un31(-2.288,2.288)
F.SilkS:
  lines w0.12: -3.61,-3.135 -3.61,-3.61 -3.135,-3.61 ; -3.61,3.61 -3.135,3.61 ; 3.135,-3.61 3.61,-3.61 3.61,-3.135 ; 3.135,3.61 3.61,3.61 3.61,3.135
F.Paste:
  region: 2.427,-1.811 2.224,-1.811 2.148,-1.735 2.148,-1.265 2.224,-1.189 2.427,-1.189
  region: -0.189,-2.224 -0.189,-2.427 -0.811,-2.427 -0.811,-2.224 -0.735,-2.148 -0.265,-2.148
  region: -2.172,-2.275 -2.172,-2.403 -2.403,-2.403 -2.403,-2.172 -2.275,-2.172
  region: -2.148,1.735 -2.148,1.265 -2.224,1.189 -2.427,1.189 -2.427,1.811 -2.224,1.811
  region: 2.427,1.189 2.224,1.189 2.148,1.265 2.148,1.735 2.224,1.811 2.427,1.811
  region: -0.189,2.224 -0.265,2.148 -0.735,2.148 -0.811,2.224 -0.811,2.427 -0.189,2.427
  region: -2.148,-1.265 -2.148,-1.735 -2.224,-1.811 -2.427,-1.811 -2.427,-1.189 -2.224,-1.189
  region: 2.403,-2.403 2.172,-2.403 2.172,-2.275 2.275,-2.172 2.403,-2.172
  region: 0.811,2.224 0.735,2.148 0.265,2.148 0.189,2.224 0.189,2.427 0.811,2.427
  region: 2.427,-0.811 2.224,-0.811 2.148,-0.735 2.148,-0.265 2.224,-0.189 2.427,-0.189
  region: 1.811,-2.224 1.811,-2.427 1.189,-2.427 1.189,-2.224 1.265,-2.148 1.735,-2.148
  region: 2.403,2.172 2.275,2.172 2.172,2.275 2.172,2.403 2.403,2.403
  region: -2.148,-0.265 -2.148,-0.735 -2.224,-0.811 -2.427,-0.811 -2.427,-0.189 -2.224,-0.189
  region: -1.189,-2.224 -1.189,-2.427 -1.811,-2.427 -1.811,-2.224 -1.735,-2.148 -1.265,-2.148
  region: -2.148,0.735 -2.148,0.265 -2.224,0.189 -2.427,0.189 -2.427,0.811 -2.224,0.811
  region: -2.172,2.275 -2.275,2.172 -2.403,2.172 -2.403,2.403 -2.172,2.403
  region: 2.427,0.189 2.224,0.189 2.148,0.265 2.148,0.735 2.224,0.811 2.427,0.811
  region: 0.811,-2.224 0.811,-2.427 0.189,-2.427 0.189,-2.224 0.265,-2.148 0.735,-2.148
  region: -1.189,2.224 -1.265,2.148 -1.735,2.148 -1.811,2.224 -1.811,2.427 -1.189,2.427
  region: 1.811,2.224 1.735,2.148 1.265,2.148 1.189,2.224 1.189,2.427 1.811,2.427
F.CrtYd:
  lines w0.05: -4.12,-4.12 -4.12,4.12 4.12,4.12 4.12,-4.12 -4.12,-4.12
F.Fab:
  lines w0.1: -3.5,-3.5 -3.5,2.5 -2.5,3.5 3.5,3.5 3.5,-3.5 -3.5,-3.5
  text "'.Designator'" at -4.047,-0.84 h1

## Texas_S-PVQFN-N64_EP4.25x4.25mm [mm]
pads (69):
  rrect25% 0.875x0.25 smd: 1(-4.437,3.75) 2(-4.437,3.25) 3(-4.437,2.75) 4(-4.437,2.25) 5(-4.437,1.75) 6(-4.437,1.25) 7(-4.437,0.75) 8(-4.437,0.25) 9(-4.437,-0.25) 10(-4.437,-0.75) 11(-4.437,-1.25) 12(-4.437,-1.75) 13(-4.437,-2.25) 14(-4.437,-2.75) 15(-4.437,-3.25) 16(-4.437,-3.75) 33(4.437,-3.75) 34(4.437,-3.25) 35(4.437,-2.75) 36(4.437,-2.25) 37(4.437,-1.75) 38(4.437,-1.25) 39(4.437,-0.75) 40(4.437,-0.25) 41(4.437,0.25) 42(4.437,0.75) 43(4.437,1.25) 44(4.437,1.75) 45(4.437,2.25) 46(4.437,2.75) 47(4.437,3.25) 48(4.437,3.75)
  rrect25% 0.25x0.875 smd: 17(-3.75,-4.437) 18(-3.25,-4.437) 19(-2.75,-4.437) 20(-2.25,-4.437) 21(-1.75,-4.437) 22(-1.25,-4.437) 23(-0.75,-4.437) 24(-0.25,-4.437) 25(0.25,-4.437) 26(0.75,-4.437) 27(1.25,-4.437) 28(1.75,-4.437) 29(2.25,-4.437) 30(2.75,-4.437) 31(3.25,-4.437) 32(3.75,-4.437) 49(3.75,4.437) 50(3.25,4.437) 51(2.75,4.437) 52(2.25,4.437) 53(1.75,4.437) 54(1.25,4.437) 55(0.75,4.437) 56(0.25,4.437) 57(-0.25,4.437) 58(-0.75,4.437) 59(-1.25,4.437) 60(-1.75,4.437) 61(-2.25,4.437) 62(-2.75,4.437) 63(-3.25,4.437) 64(-3.75,4.437)
  rect 4.25x4.25 smd: 65(0,0)
  rrect15% 1.71x1.71 on Top Paste: Un1(1.06,1.06) Un2(-1.06,-1.06) Un3(-1.06,1.06) Un4(1.06,-1.06)
F.SilkS:
  lines w0.12: -4.61,-4.135 -4.61,-4.61 -4.135,-4.61 ; -4.61,4.61 -4.135,4.61 ; 4.135,-4.61 4.61,-4.61 4.61,-4.135 ; 4.135,4.61 4.61,4.61 4.61,4.135
F.CrtYd:
  lines w0.05: -5.12,-5.12 5.12,-5.12 5.12,5.12 -5.12,5.12 -5.12,-5.12
F.Fab:
  lines w0.1: -4.5,-4.5 -4.5,3.5 -3.5,4.5 4.5,4.5 4.5,-4.5 -4.5,-4.5
  text "'.Designator'" at -4.047,-0.84 h1

## Texas_S-PVQFN-N64_EP4.25x4.25mm_ThermalVias [mm]
pads (127):
  rrect25% 0.875x0.25 smd: 1(-4.437,3.75) 2(-4.437,3.25) 3(-4.437,2.75) 4(-4.437,2.25) 5(-4.437,1.75) 6(-4.437,1.25) 7(-4.437,0.75) 8(-4.437,0.25) 9(-4.437,-0.25) 10(-4.437,-0.75) 11(-4.437,-1.25) 12(-4.437,-1.75) 13(-4.437,-2.25) 14(-4.437,-2.75) 15(-4.437,-3.25) 16(-4.437,-3.75) 33(4.437,-3.75) 34(4.437,-3.25) 35(4.437,-2.75) 36(4.437,-2.25) 37(4.437,-1.75) 38(4.437,-1.25) 39(4.437,-0.75) 40(4.437,-0.25) 41(4.437,0.25) 42(4.437,0.75) 43(4.437,1.25) 44(4.437,1.75) 45(4.437,2.25) 46(4.437,2.75) 47(4.437,3.25) 48(4.437,3.75)
  rrect25% 0.25x0.875 smd: 17(-3.75,-4.437) 18(-3.25,-4.437) 19(-2.75,-4.437) 20(-2.25,-4.437) 21(-1.75,-4.437) 22(-1.25,-4.437) 23(-0.75,-4.437) 24(-0.25,-4.437) 25(0.25,-4.437) 26(0.75,-4.437) 27(1.25,-4.437) 28(1.75,-4.437) 29(2.25,-4.437) 30(2.75,-4.437) 31(3.25,-4.437) 32(3.75,-4.437) 49(3.75,4.437) 50(3.25,4.437) 51(2.75,4.437) 52(2.25,4.437) 53(1.75,4.437) 54(1.25,4.437) 55(0.75,4.437) 56(0.25,4.437) 57(-0.25,4.437) 58(-0.75,4.437) 59(-1.25,4.437) 60(-1.75,4.437) 61(-2.25,4.437) 62(-2.75,4.437) 63(-3.25,4.437) 64(-3.75,4.437)
  round 0.5 hole 0.2: 65(-1.6,-1.6) 65(-1.6,-0.8) 65(-1.6,0) 65(-1.6,0.8) 65(-1.6,1.6) 65(-0.8,-1.6) 65(-0.8,-0.8) 65(-0.8,0) 65(-0.8,0.8) 65(-0.8,1.6) 65(0,-1.6) 65(0,-0.8) 65(0,0) 65(0,0.8) 65(0,1.6) 65(0.8,-1.6) 65(0.8,-0.8) 65(0.8,0) 65(0.8,0.8) 65(0.8,1.6) 65(1.6,-1.6) 65(1.6,-0.8) 65(1.6,0) 65(1.6,0.8) 65(1.6,1.6)
  rect 4.25x4.25 smd: 65(0,0)
  rect 3.7x3.7 smd far side: 65(0,0)
  round 0.555 on Top Paste: Un1(-1.2,-1.2) Un2(-0.4,0.4) Un4(1.2,-0.4) Un5(-0.4,1.2) Un7(-1.2,0.4) Un10(-1.2,-0.4) Un12(-1.2,1.2) Un16(1.2,1.2) Un18(0.4,-0.4) Un21(0.4,1.2) Un26(0.4,0.4) Un28(0.4,-1.2) Un29(1.2,-1.2) Un31(-0.4,-1.2) Un35(-0.4,-0.4) Un36(1.2,0.4)
  round 0.295 on Top Paste: Un3(1.863,1.863) Un8(-1.863,-1.863) Un13(-1.863,1.863) Un14(1.863,-1.863)
  round 0.314 on Top Paste: Un6(1.2,1.863) Un9(0.4,1.863) Un11(-0.4,1.863) Un15(0.4,-1.863) Un17(1.863,0.4) Un19(-1.2,1.863) Un20(1.2,-1.863) Un22(1.863,1.2) Un23(-1.863,-0.4) Un24(1.863,-0.4) Un25(-1.863,-1.2) Un27(-0.4,-1.863) Un30(-1.2,-1.863) Un32(1.863,-1.2) Un33(-1.863,1.2) Un34(-1.863,0.4)
F.SilkS:
  lines w0.12: -4.61,-4.135 -4.61,-4.61 -4.135,-4.61 ; -4.61,4.61 -4.135,4.61 ; 4.135,-4.61 4.61,-4.61 4.61,-4.135 ; 4.135,4.61 4.61,4.61 4.61,4.135
F.Paste:
  drawing of 36 lines, arcs and shapes, not listed
F.CrtYd:
  lines w0.05: -5.12,-5.12 5.12,-5.12 5.12,5.12 -5.12,5.12 -5.12,-5.12
F.Fab:
  lines w0.1: -4.5,-4.5 4.5,-4.5 4.5,4.5 -3.5,4.5 -4.5,3.5 -4.5,-4.5
  text "'.Designator'" at -4.047,-0.84 h1

## Texas_S-PWQFN-N16_EP2.1x2.1mm [mm]
pads (21):
  rrect25% 1.025x0.35 smd: 1(-1.863,0.975) 2(-1.863,0.325) 3(-1.863,-0.325) 4(-1.863,-0.975) 9(1.863,-0.975) 10(1.863,-0.325) 11(1.863,0.325) 12(1.863,0.975)
  rrect25% 0.35x1.025 smd: 5(-0.975,-1.863) 6(-0.325,-1.863) 7(0.325,-1.863) 8(0.975,-1.863) 13(0.975,1.863) 14(0.325,1.863) 15(-0.325,1.863) 16(-0.975,1.863)
  rect 2.1x2.1 smd: 17(0,0)
  rrect25% 0.85x0.85 on Top Paste: Un1(0.525,0.525) Un2(-0.525,-0.525) Un3(-0.525,0.525) Un4(0.525,-0.525)
F.SilkS:
  lines w0.12: -2.11,-1.41 -2.11,-2.11 -1.41,-2.11 ; -2.11,2.11 -1.41,2.11 ; 1.41,-2.11 2.11,-2.11 2.11,-1.41 ; 1.41,2.11 2.11,2.11 2.11,1.41
F.CrtYd:
  lines w0.05: -2.62,-2.62 2.62,-2.62 2.62,2.62 -2.62,2.62 -2.62,-2.62
F.Fab:
  lines w0.1: -2,-2 -2,1 -1,2 2,2 2,-2 -2,-2
  text "'.Designator'" at -4.047,-0.84 h1